# Altium footprint library Footprint.PcbLib: 137 footprints (part 7 of 9)
Each footprint in its own frame and in the unit in brackets; x right, y up, seen from the top. Pads: shape width x height; smd on the part's side, far side on the other; paste and mask are expansions set on the pad; w line width, h text height; cw(c..) or ccw(c..) is an arc to the next point about the centre after c.
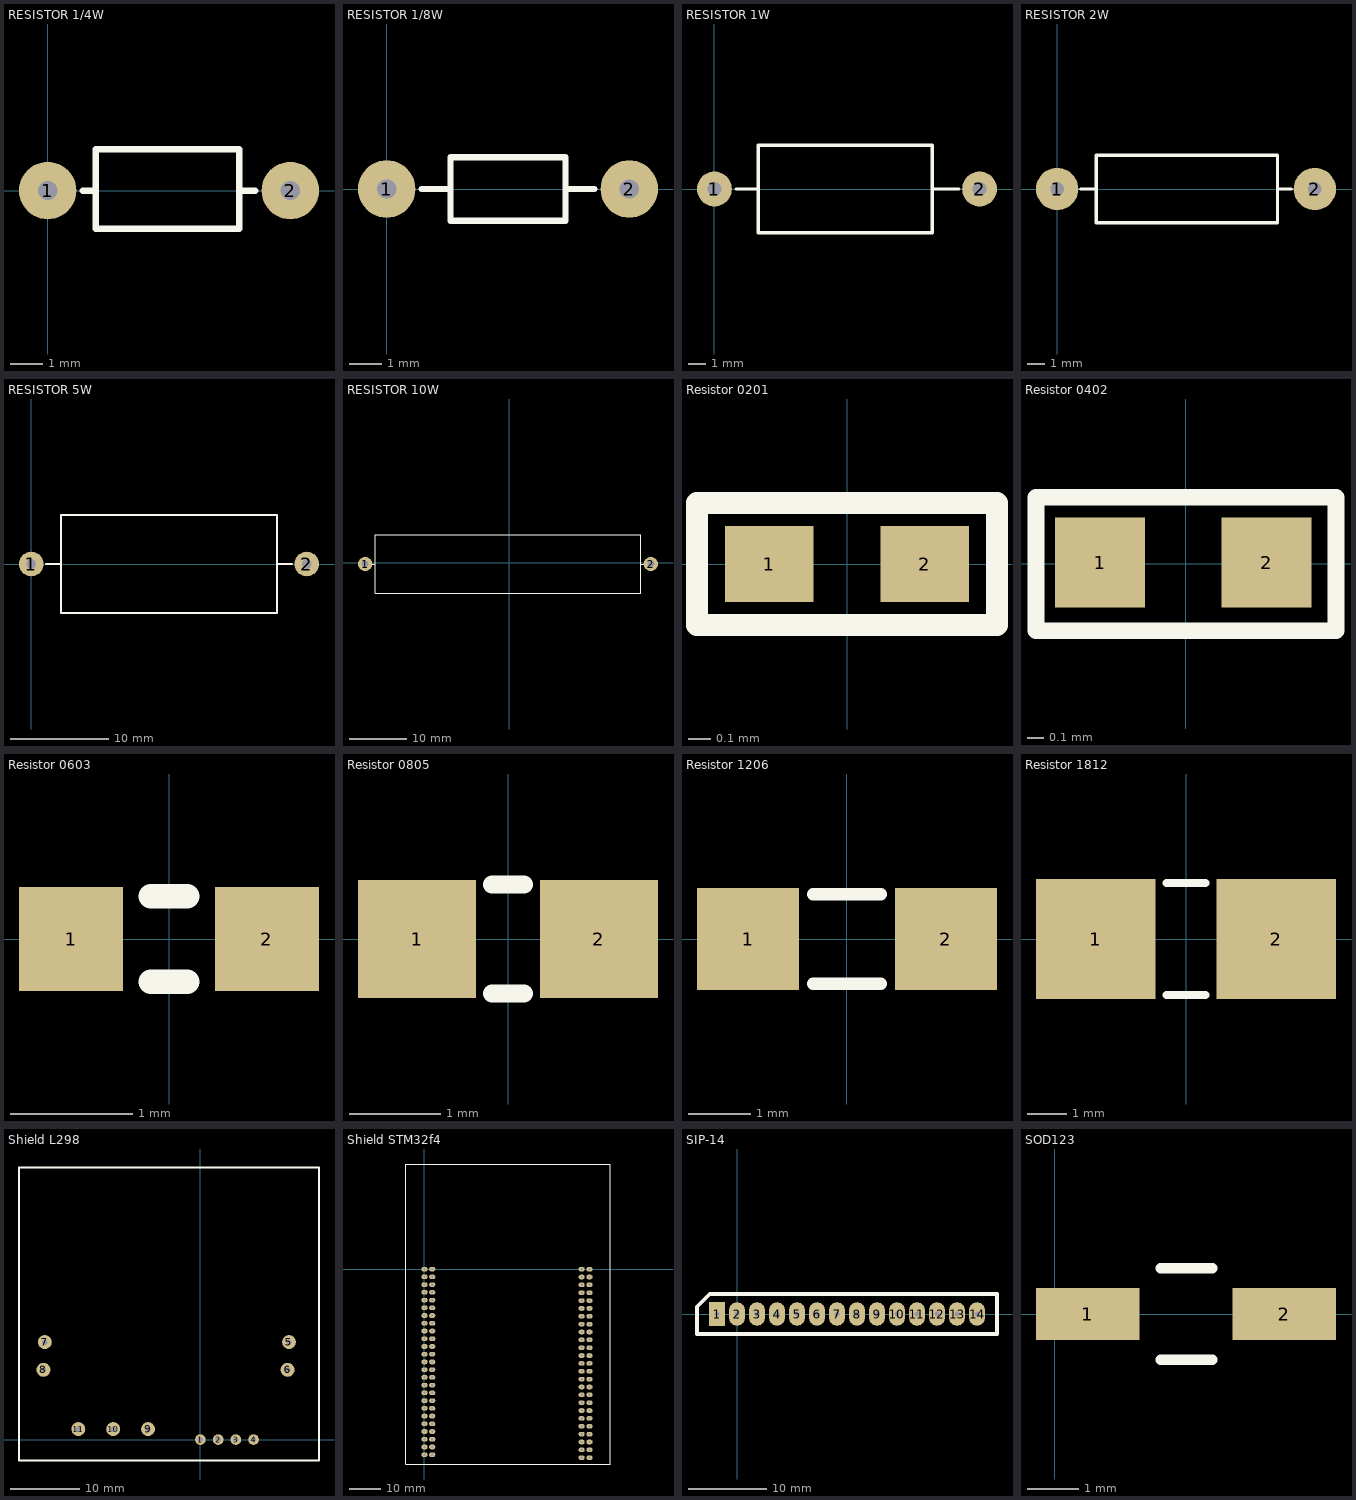
[diagram p6: the footprints below, top view; thin cyan lines are the x and y axes]

## RESISTOR 1/4W [mm] "P=0.25W, PITCH = 7.6 mm"
pads (2):
  round 1.8 hole 0.6: 1(0,0) 2(7.6,0)
Top Overlay:
  lines w0.2: 1.1,0 1.5,0 ; 6,0 6.5,0 ; 1.5,-1.2 6,-1.2 6,1.3 1.5,1.3 1.5,-1.2
3D body "R 0.25w bt.STEP": height 2.7, standoff -3.5, extent -0.31,-1.204 7.91,1.204

## RESISTOR 1/8W [mm] "p=0.125w, pitch=7.6mm"
pads (2):
  round 1.8 hole 0.6: 1(0,0) 2(7.6,0)
Top Overlay:
  lines w0.2: 1.1,0 2,0 ; 5.6,0 6.5,0 ; 2,-1 2,1 5.6,1 5.6,-1 2,-1
3D body "R 0.125W bt.STEP": height 2.1, standoff -3.8, extent -0.2,-0.9 7.8,0.9

## RESISTOR 1W [mm] "P=1W, ptich = 15.2mm"
pads (2):
  round 2 hole 0.8: 1(0,0) 2(15.2,0)
Top Overlay:
  lines w0.2: 1.25,0 2.5,0 ; 12.5,0 14,0 ; 2.5,-2.5 2.5,2.5 12.5,2.5 12.5,-2.5 2.5,-2.5
3D body "R 1W bt.STEP": height 5.5, standoff -2.5, extent -0.35,-2.503 15.59,2.497

## RESISTOR 2W [mm] "P=2W, pitch = 15.2mm"
pads (2):
  round 2.5 hole 0.8: 1(0,0) 2(15.2,0)
Top Overlay:
  lines w0.2: 1.4,0 2.3,0 ; 13.1,0 13.8,0 ; 2.3,-2 2.3,2 13,2 13,-2 2.3,-2
3D body "R 2W bt.STEP": height 5, standoff -3, extent -0.4,-2 15.64,2

## RESISTOR 5W [mm] "P=2W, pitch = 28mm"
pads (2):
  round 2.5 hole 1: 1(0,0) 2(28,0)
Top Overlay:
  lines w0.2: 1.5,0 3,0 ; 25,0 26.5,0 ; 3,-5 25,-5 25,5 3,5 3,-5
3D body "R 5W bt.step": height 9.5, standoff -3.1, extent -0.345,-5 28.345,5

## RESISTOR 10W [mil] "Resistor 10W pitch=1960mils"
pads (2):
  round 98.43 hole 48: 1(-990,-10) 2(970,-10)
Top Overlay:
  lines w7.87: -990,-10 -921,-10 ; 901,-10 970,-10 ; -921,-211 -921,191 901,191 901,-211 -921,-211
3D body "10W Resistor.STEP": height 363.6, standoff -97.43, extent -1009.68,-214.99 989.69,195

## Resistor 0201 [mm] "Resistor 0201"
height 0.2
pads (2):
  rect 0.4x0.34 smd: 1(-0.35,0) 2(0.35,0)
Top Overlay:
  lines w0.1: -0.675,-0.275 -0.675,0.275 0.675,0.275 0.675,-0.275 -0.675,-0.275
3D body "Resistor 0201.step": height 0.2, standoff 0, extent -0.3,-0.15 0.3,0.15

## Resistor 0402 [mm] "Resistor 0402"
pads (2):
  rect 0.54x0.54 smd: 1(-0.516,0.008) 2(0.484,0.008)
Top Overlay:
  lines w0.1: -0.9,-0.4 0.9,-0.4 0.9,0.4 -0.9,0.4 -0.9,-0.4
3D body "Resistor 0402.step": height 0.3, standoff 0, extent -0.516,-0.242 0.484,0.258

## Resistor 0603 [mm] "Resistor 0603"
height 0.4
pads (2):
  rect 0.85x0.85 smd: 1(-0.8,0) 2(0.8,0)
Top Overlay:
  lines w0.2: -0.15,-0.35 0.15,-0.35 ; -0.15,0.35 0.15,0.35
3D body "Resistor 0603.step": height 0.4, standoff 0, extent -0.8,-0.4 0.8,0.4

## Resistor 0805 [mm] "Resistor 0805"
height 0.6
pads (2):
  rect 1.3x1.3 smd: 1(-1,0) 2(1,0)
Top Overlay:
  lines w0.2: -0.175,-0.6 0.175,-0.6 ; -0.175,0.6 0.175,0.6
3D body "Resistor 0805.step": height 0.6, standoff 0, extent -1,-0.625 1,0.625

## Resistor 1206 [mm] "Resistor 1206"
height 0.8
pads (2):
  rect 1.65x1.65 smd: 1(-1.6,0) 2(1.6,0)
Top Overlay:
  lines w0.2: -0.55,-0.725 0.55,-0.725 ; -0.55,0.725 0.55,0.725
3D body: height 0.8, standoff 0, extent 0.9,-0.8 1.6,0.8
3D body: height 0.8, standoff 0, extent -1.6,-0.8 -0.9,0.8
3D body: height 0.8, standoff 0, extent -0.9,-0.8 0.9,0.8

## Resistor 1812 [mm] "Resistor 1812"
height 1
pads (2):
  rect 3.05x3.05 smd: 1(-2.3,0) 2(2.3,0)
Top Overlay:
  lines w0.2: -0.5,-1.425 0.5,-1.425 ; -0.5,1.425 0.5,1.425
3D body "Resistor 1812.step": height 1, standoff 0, extent -2.3,-1.5 2.3,1.5

## Shield L298 [mm] "Shield L298"
pads (11):
  round 1.524 hole 0.762: 1(0,0) 2(2.54,0) 3(5.08,0) 4(7.62,0)
  round 2 hole 0.762: 5(12.7,13.97) 6(12.5,10) 7(-22.3,13.97) 8(-22.5,10) 9(-7.5,1.5) 10(-12.5,1.5) 11(-17.5,1.5)
Top Overlay:
  lines w0.254: -26,-3 -26,2 -26,39 17,39 17,-3 -26,-3

## Shield STM32f4 [mm] "shield 100dim STM 32f4"
pads (100):
  oval 2x1.5 hole 0.762: 1(53.34,0) 2(50.8,0) 3(53.34,-2.54) 4(50.8,-2.54) 5(53.34,-5.08) 6(50.8,-5.08) 7(53.34,-7.62) 8(50.8,-7.62) 9(53.34,-10.16) 10(50.8,-10.16) 11(53.34,-12.7) 12(50.8,-12.7) 13(53.34,-15.24) 14(50.8,-15.24) 15(53.34,-17.78) 16(50.8,-17.78) 17(53.34,-20.32) 18(50.8,-20.32) 19(53.34,-22.86) 20(50.8,-22.86) 21(53.34,-25.4) 22(50.8,-25.4) 23(53.34,-27.94) 24(50.8,-27.94) 25(53.34,-30.48) 26(50.8,-30.48) 27(53.34,-33.02) 28(50.8,-33.02) 29(53.34,-35.56) 30(50.8,-35.56) 31(53.34,-38.1) 32(50.8,-38.1) 33(53.34,-40.64) 34(50.8,-40.64) 35(53.34,-43.18) 36(50.8,-43.18) 37(53.34,-45.72) 38(50.8,-45.72) 39(53.34,-48.26) 40(50.8,-48.26) 41(53.34,-50.8) 42(50.8,-50.8) 43(53.34,-53.34) 44(50.8,-53.34) 45(53.34,-55.88) 46(50.8,-55.88) 47(53.34,-58.42) 48(50.8,-58.42) 49(53.34,-60.96) 50(50.8,-60.96) 51(0,0) 52(2.5,0) 53(0,-2.5) 54(2.5,-2.5) 55(0,-5) 56(2.5,-5) 57(0,-7.5) 58(2.5,-7.5) 59(0,-10) 60(2.5,-10) 61(0,-12.5) 62(2.5,-12.5) 63(0,-15) 64(2.5,-15) 65(0,-17.5) 66(2.5,-17.5) 67(0,-20) 68(2.5,-20) 69(0,-22.5) 70(2.5,-22.5) 71(0,-25) 72(2.5,-25) 73(0,-27.5) 74(2.5,-27.5) 75(0,-30) 76(2.5,-30) 77(0,-32.5) 78(2.5,-32.5) 79(0,-35) 80(2.5,-35) 81(0,-37.5) 82(2.5,-37.5) 83(0,-40) 84(2.5,-40) 85(0,-42.5) 86(2.5,-42.5) 87(0,-45) 88(2.5,-45) 89(0,-47.5) 90(2.5,-47.5) 91(0,-50) 92(2.5,-50) 93(0,-52.5) 94(2.5,-52.5) 95(0,-55) 96(2.5,-55) 97(0,-57.5) 98(2.5,-57.5) 99(0,-60) 100(2.5,-60)
Top Overlay:
  lines w0.254: -6,-63 60,-63 60,34 -6,34 -6,-63

## SIP-14 [mm] "SIP-14, pitch = 100mil"
pads (14):
  rect 2x3 hole 0.6: 1(-2.54,0)
  oval 2x3 hole 0.6: 2(0,0) 3(2.54,0) 4(5.08,0) 5(7.62,0) 6(10.16,0) 7(12.7,0) 8(15.24,0) 9(17.78,0) 10(20.32,0) 11(22.86,0) 12(25.4,0) 13(27.94,0) 14(30.48,0)
Top Overlay:
  lines w0.5: -5.08,-2.54 33.02,-2.54 33.02,2.54 -3.46,2.54 -5.08,0.92 -5.08,-2.54
3D body: height 12, standoff 1, extent -5.08,-2.54 33.02,2.54

## SOD123 [mm] "DIODE SOD123, PITCH=100 MILS"
pads (2):
  rect 2x1 smd: 1(0.635,0) 2(4.445,0)
Top Overlay:
  lines w0.2: 2.048,-0.889 3.048,-0.889 ; 2.048,0.889 3.048,0.889
3D body "CircuitWorks-SOD123.step": height 1.27, standoff 0, extent 0.69,-0.8 4.39,0.8